# Altium schematic symbol library FPGA_Xilinx_Virtex5.SchLib: 41 symbols (part 7 of 27) (continued)
## XC5VLX50T-FF665 (continued)
part D pins: AA5 IO_L9P_CC_18 (io), AA6 VCCO_18 (power), AA7 IO_L7P_18 (io), AA8 IO_L7N_18 (io), AA9 IO_L19N_18 (io), AB5 IO_L9N_CC_18 (io), AB6 IO_L10P_CC_18 (io), AB7 IO_L10N_CC_18 (io), AB9 IO_L19P_18 (io), AB22 IO_L7N_17 (io), AB23 VCCO_17 (power), AC6 IO_L12P_VRN_18 (io), AC7 IO_L16N_18 (io), AC8 IO_L17P_18 (io), AC9 IO_L18N_18 (io), AC10 VCCO_18 (power), AC20 VCCO_17 (power), AC21 IO_L11P_CC_17 (io), AC22 IO_L7P_17 (io), AC23 IO_L6N_17 (io), AC24 IO_L6P_17 (io), AC26 IO_L0P_17 (io), AD4 IO_L14N_VREF_18 (io), AD5 IO_L12N_VRP_18 (io), AD6 IO_L16P_18 (io), AD7 VCCO_18 (power), AD8 IO_L17N_18 (io), AD9 IO_L18P_18 (io), AD10 IO_L4P_18 (io), AD11 IO_L2N_18 (io), AD13 IO_L19P_17 (io), AD14 IO_L19N_17 (io), AD15 IO_L16P_17 (io), AD16 IO_L15N_17 (io), AD18 IO_L13N_17 (io), AD19 IO_L10P_CC_17 (io), AD20 IO_L10N_CC_17 (io), AD21 IO_L11N_CC_17 (io), AD23 IO_L5N_17 (io), AD24 IO_L1N_17 (io), AD25 IO_L1P_17 (io), AD26 IO_L0N_17 (io), AE5 IO_L14P_18 (io), AE6 IO_L13P_18 (io), AE7 IO_L11N_CC_18 (io), AE8 IO_L11P_CC_18 (io), AE10 IO_L4N_VREF_18 (io), AE11 IO_L2P_18 (io), AE12 IO_L0N_18 (io), AE13 IO_L18N_17 (io), AE15 IO_L16N_17 (io), AE16 IO_L15P_17 (io), AE17 IO_L14P_17 (io), AE18 IO_L13P_17 (io), AE20 IO_L9N_CC_17 (io), AE21 IO_L8N_CC_17 (io), AE22 IO_L5P_17 (io), AE23 IO_L4N_VREF_17 (io), AE24 VCCO_17 (power), AE25 IO_L2P_17 (io), AE26 IO_L2N_17 (io), AF3 IO_L15N_18 (io), AF4 IO_L15P_18 (io), AF5 IO_L13N_18 (io), AF7 IO_L8P_CC_18 (io), AF8 IO_L8N_CC_18 (io), AF9 IO_L6P_18 (io), AF10 IO_L6N_18 (io), AF12 IO_L0P_18 (io), AF13 IO_L18P_17 (io), AF14 IO_L17N_17 (io), AF15 IO_L17P_17 (io), AF17 IO_L14N_VREF_17 (io), AF18 IO_L12N_VRP_17 (io), AF19 IO_L12P_VRN_17 (io), AF20 IO_L9P_CC_17 (io), AF22 IO_L8P_CC_17 (io), AF23 IO_L4P_17 (io), AF24 IO_L3N_17 (io), AF25 IO_L3P_17 (io), V8 IO_L1P_18 (io), V9 IO_L1N_18 (io), W8 IO_L3N_18 (io), W9 IO_L3P_18 (io), Y7 IO_L5P_18 (io), Y8 IO_L5N_18 (io)
part E pins: AA10 IO_L2P_A23_2 (io), AA12 IO_L4N_VREF_FOE_B_MOSI_2 (io), AA13 IO_L6P_D7_2 (io), AA14 IO_L6N_D6_2 (io), AA15 IO_L9N_D0_FS0_2 (io), AA16 VCCO_2 (power), AA17 IO_L5P_FWE_B_2 (io), AA18 IO_L3P_A21_2 (io), AA19 IO_L1N_CC_A24_2 (io), AD17 VCCO_2 (power), D13 IO_L2N_GC_VRP_3 (io), D14 IO_L2P_GC_VRN_3 (io), D15 IO_L0P_CC_GC_3 (io), D16 IO_L1P_CC_GC_3 (io), D17 VCCO_3 (power), D18 IO_L3N_GC_3 (io), E10 IO_L8P_GC_3 (io), E11 IO_L6N_GC_3 (io), E12 IO_L4N_GC_VREF_3 (io), E13 IO_L4P_GC_3 (io), E15 IO_L0N_CC_GC_3 (io), E16 IO_L1N_CC_GC_3 (io), E17 IO_L3P_GC_3 (io), E18 IO_L5P_GC_3 (io), E20 IO_L7P_GC_3 (io), E21 IO_L7N_GC_3 (io), F10 IO_L8N_GC_3 (io), F12 IO_L6P_GC_3 (io), F19 IO_L5N_GC_3 (io), F20 IO_L9P_GC_3 (io), G18 VCCO_3 (power), G21 IO_L9N_GC_3 (io), W11 IO_L0P_CC_RS1_2 (io), W14 IO_L8N_D2_FS2_2 (io), W16 IO_L7N_D4_2 (io), Y10 IO_L0N_CC_RS0_2 (io), Y11 IO_L2N_A22_2 (io), Y12 IO_L4P_FCS_B_2 (io), Y13 IO_L8P_D3_2 (io), Y15 IO_L9P_D1_FS1_2 (io), Y16 IO_L7P_D5_2 (io), Y17 IO_L5N_CSO_B_2 (io), Y18 IO_L3N_A20_2 (io), Y20 IO_L1P_CC_A25_2 (io)
part F pins: AA20 IO_L0N_GC_D14_4 (io), AB10 IO_L1P_GC_D13_4 (io), AB11 IO_L1N_GC_D12_4 (io), AB12 IO_L3N_GC_D8_4 (io), AB13 VCCO_4 (power), AB14 IO_L7P_GC_VRN_4 (io), AB15 IO_L9P_CC_GC_4 (io), AB16 IO_L8N_CC_GC_4 (io), AB17 IO_L6N_GC_4 (io), AB19 IO_L4P_GC_4 (io), AB20 IO_L2N_GC_D10_4 (io), AB21 IO_L2P_GC_D11_4 (io), AC11 IO_L3P_GC_D9_4 (io), AC12 IO_L5P_GC_4 (io), AC13 IO_L5N_GC_4 (io), AC14 IO_L7N_GC_VRP_4 (io), AC16 IO_L9N_CC_GC_4 (io), AC17 IO_L8P_CC_GC_4 (io), AC18 IO_L6P_GC_4 (io), AC19 IO_L4N_GC_VREF_4 (io), AE14 VCCO_4 (power), Y21 IO_L0P_GC_D15_4 (io)
part G pins: H2 MGTTXP0_112 (io), J1 MGTRXP0_112 (io), J2 MGTTXN0_112 (io), K1 MGTRXN0_112 (io), K3 MGTREFCLKN_112 (io), K4 MGTREFCLKP_112 (io), L1 MGTRXN1_112 (io), M1 MGTRXP1_112 (io), M2 MGTTXN1_112 (io), N2 MGTTXP1_112 (io), P2 MGTTXP0_114 (io), R1 MGTRXP0_114 (io), R2 MGTTXN0_114 (io), T1 MGTRXN0_114 (io), T3 MGTREFCLKN_114 (io), T4 MGTREFCLKP_114 (io), U1 MGTRXN1_114 (io), V1 MGTRXP1_114 (io), V2 MGTTXN1_114 (io), W2 MGTTXP1_114 (io)
part H pins: AA1 MGTRXP0_118 (io), AA2 MGTTXN0_118 (io), AB1 MGTRXN0_118 (io), AB3 MGTREFCLKN_118 (io), AB4 MGTREFCLKP_118 (io), AC1 MGTRXN1_118 (io), AD1 MGTRXP1_118 (io), AD2 MGTTXN1_118 (io), AE2 MGTTXP1_118 (io), B2 MGTTXP0_116 (io), C1 MGTRXP0_116 (io), C2 MGTTXN0_116 (io), D1 MGTRXN0_116 (io), D3 MGTREFCLKN_116 (io), D4 MGTREFCLKP_116 (io), E1 MGTRXN1_116 (io), F1 MGTRXP1_116 (io), F2 MGTTXN1_116 (io), G2 MGTTXP1_116 (io), Y2 MGTTXP0_118 (io)
part I pins: AA3 MGTAVTTRX_118 (power), AC3 MGTAVCC_118 (power), AC4 MGTAVCC_118 (power), AD3 MGTAVCCPLL_118 (power), AE3 MGTAVTTTX_118 (power), B3 MGTAVTTTX_116 (power), C3 MGTAVTTRX_116 (power), E3 MGTAVCC_116 (power), E4 MGTAVCC_116 (power), F3 MGTAVCCPLL_116 (power), G3 MGTAVTTTX_116 (power), H3 MGTAVTTTX_112 (power), J3 MGTAVTTRX_112 (power), L3 MGTAVCC_112 (power), L4 MGTAVCC_112 (power), M3 MGTAVCCPLL_112 (power), N3 MGTAVTTTX_112 (power), P3 MGTAVTTTX_114 (power), P4 MGTRREF_112 (power), P5 MGTAVTTRXC (power), R3 MGTAVTTRX_114 (power), U3 MGTAVCC_114 (power), U4 MGTAVCC_114 (power), V3 MGTAVCCPLL_114 (power), W3 MGTAVTTTX_114 (power), Y3 MGTAVTTTX_118 (power)
part J pins: F11 VCCO_0 (power), H12 INIT_B_0 (io), J10 D_IN_0 (io), J11 CCLK_0 (io), J12 VCCO_0 (power), J20 PROGRAM_B_0 (io), K11 DONE_0 (io), K20 HSWAPEN_0 (io), L20 CS_B_0 (io), M20 RDWR_B_0 (io), N14 VREFN_0 (io), N15 VP_0 (io), P14 VN_0 (io), P15 VREFP_0 (io), R14 DXN_0 (io), R15 DXP_0 (io), T20 M0_0 (io), U12 D_OUT_BUSY_0 (io), U20 M2_0 (io), V11 TCK_0 (io), V12 TDO_0 (io), V13 TDI_0 (io), W13 TMS_0 (io), W20 M1_0 (io)
part K pins: A2 GND (power), A6 GND (power), A11 GND (power), A16 GND (power), A21 GND (power), A26 GND (power), AA4 GND (power), AA11 GND (power), AA21 GND (power), AA26 GND (power), AB2 GND (power), AB8 GND (power), AB18 GND (power), AC2 GND (power), AC5 GND (power), AC15 GND (power), AC25 GND (power), AD12 GND (power), AD22 GND (power), AE4 GND (power), AE9 GND (power), AE19 GND (power), AF2 GND (power), AF6 GND (power), AF11 GND (power), AF16 GND (power), AF21 GND (power), AF26 GND (power), B8 GND (power), B18 GND (power), C4 GND (power), C5 GND (power), C15 GND (power), C20 GND (power), C25 GND (power), D2 GND (power), D12 GND (power), D22 GND (power), E2 GND (power), E9 GND (power), E19 GND (power), F4 GND (power), F6 GND (power), F16 GND (power), F26 GND (power), G13 GND (power), G23 GND (power), H10 GND (power), H14 GND (power), H15 VCCINT (power), H16 GND (power), H17 VCCINT (power), H20 GND (power), J4 GND (power), J7 GND (power), J13 GND (power), J14 VCCINT (power), J15 GND (power), J16 VCCINT (power), J17 GND (power), J18 VCCINT (power), J19 VBATT_0 (power), K2 GND (power), K9 VCCAUX (power), K10 GND (power), K12 GND (power), K13 VCCINT (power), K14 GND (power), K15 VCCINT (power), K16 GND (power), K17 VCCINT (power), K18 GND (power), K19 VCCINT (power), K24 GND (power), L2 GND (power), L9 GND (power), L10 VCCINT (power), L11 GND (power), L12 VCCINT (power), L13 GND (power), L14 VCCINT (power), L15 GND (power), L16 VCCINT (power), L17 GND (power), L18 VCCINT (power), L19 GND (power), L21 GND (power), L26 GND (power), M4 GND (power), M8 GND (power), M9 VCCAUX (power), M10 GND (power), M11 VCCINT (power), M12 GND (power), M13 VCCINT (power), M14 AVSS_0 (power), M15 AVDD_0 (power), M16 GND (power), M17 VCCINT (power), M18 GND (power), M19 VCCAUX (power), N5 GND (power), N9 GND (power), N10 VCCINT (power), N11 GND (power), N12 VCCINT (power), N13 GND (power), N16 VCCINT (power), N17 GND (power), N18 VCCINT (power), N19 GND (power), N20 VCCAUX (power), N25 GND (power), P9 VCCAUX (power), P10 GND (power), P11 VCCINT (power), P12 GND (power), P13 VCCINT (power), P16 GND (power), P17 VCCINT (power), P18 GND (power), P19 VCCAUX (power), P22 GND (power), R4 GND (power), R9 GND (power), R10 VCCINT (power), R11 GND (power), R12 VCCINT (power), R13 GND (power), R16 VCCINT (power), R17 GND (power), R18 VCCINT (power), R19 GND (power), T2 GND (power), T6 GND (power), T9 VCCAUX (power), T10 GND (power), T11 VCCINT (power), T12 GND (power), T13 VCCINT (power), T14 GND (power), T15 VCCINT (power), T16 GND (power), T17 VCCINT (power), T18 GND (power), T19 VCCAUX (power), T21 GND (power), T26 GND (power), U2 GND (power), U8 VCCAUX (power), U9 GND (power), U10 VCCINT (power), U11 GND (power), U13 GND (power), U14 VCCINT (power), U15 GND (power), U16 VCCINT (power), U17 GND (power), U18 VCCINT (power), U19 GND (power), U23 GND (power), V4 GND (power), V5 GND (power), V10 GND (power), V14 GND (power), V15 VCCINT (power), V16 GND (power), V17 VCCINT (power), V18 GND (power), V19 VCCAUX (power), V20 GND (power), W7 GND (power), W10 VCCAUX (power), W12 GND (power), W15 GND (power), W17 GND (power), W18 VCCINT (power), W19 GND (power), Y9 GND (power), Y14 GND (power), Y19 VCCAUX (power), Y24 GND (power)

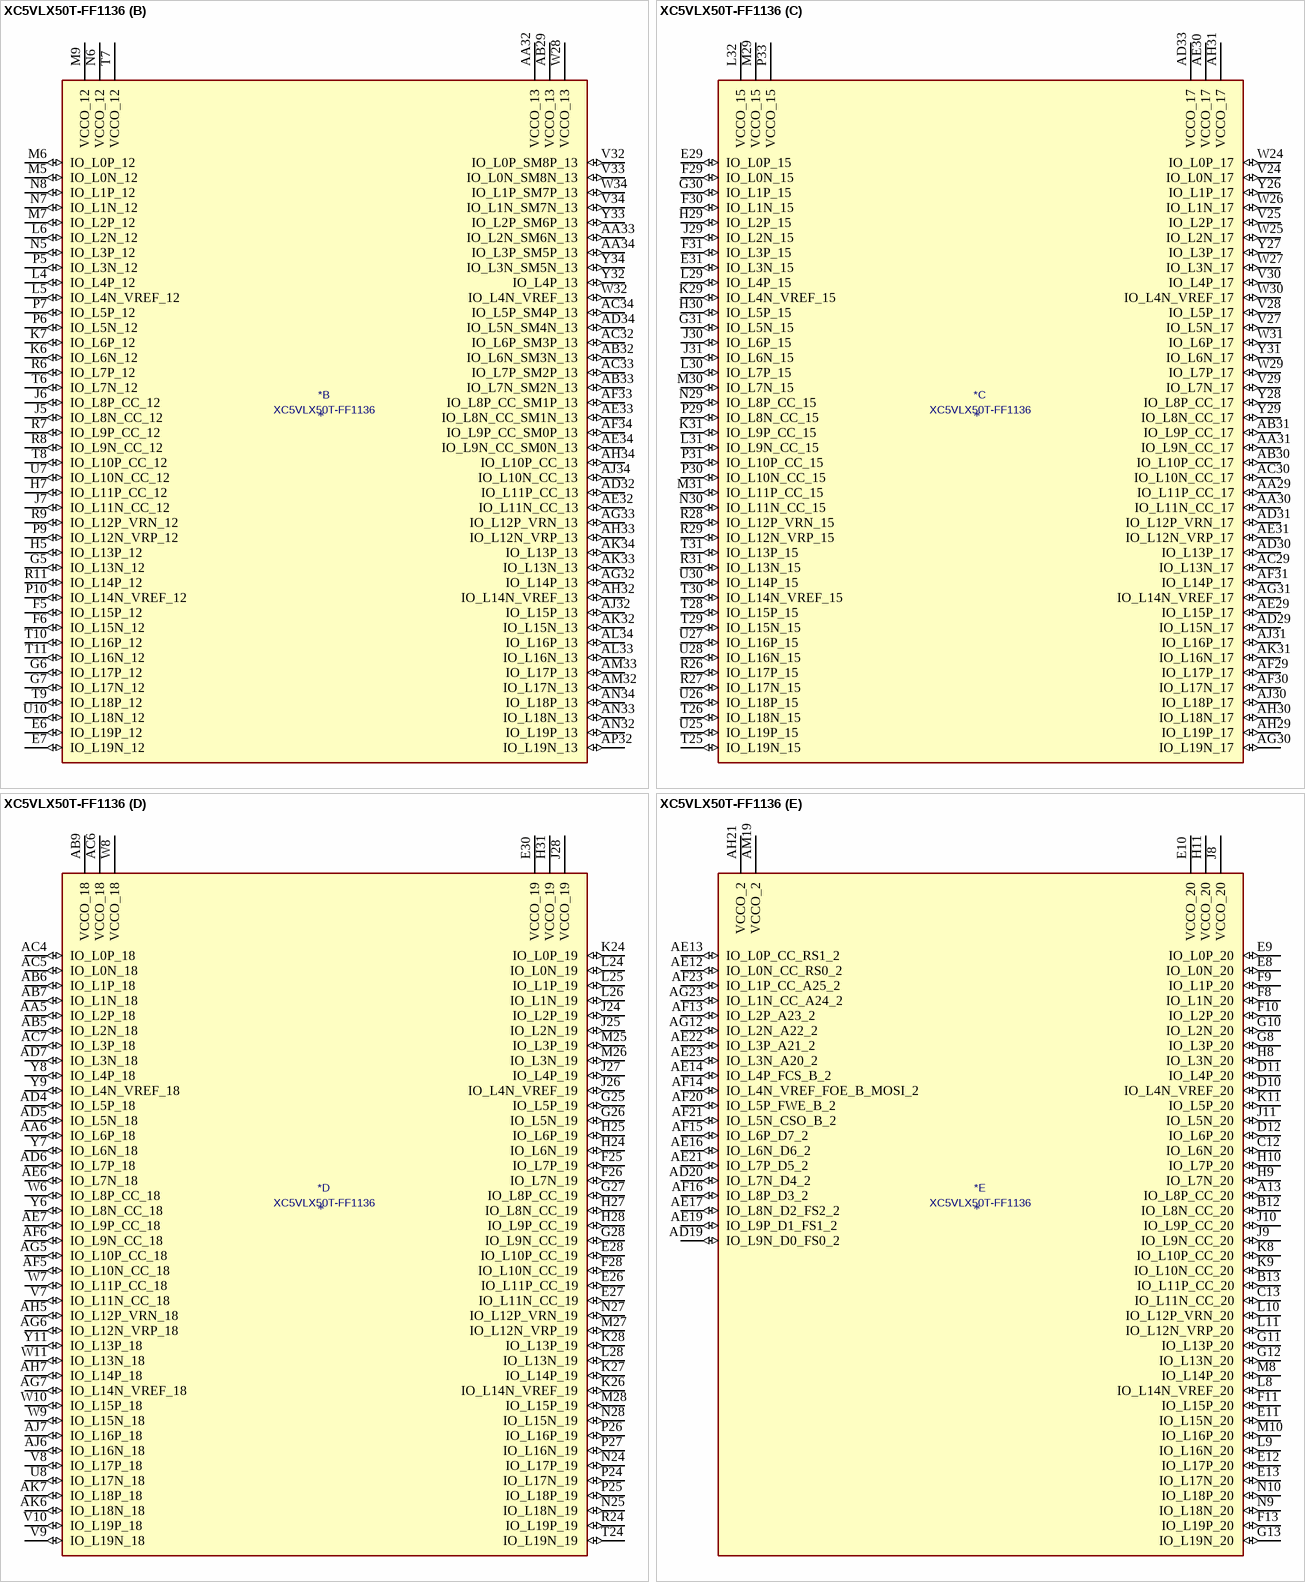
[diagram p44: symbol XC5VLX50T-FF1136]

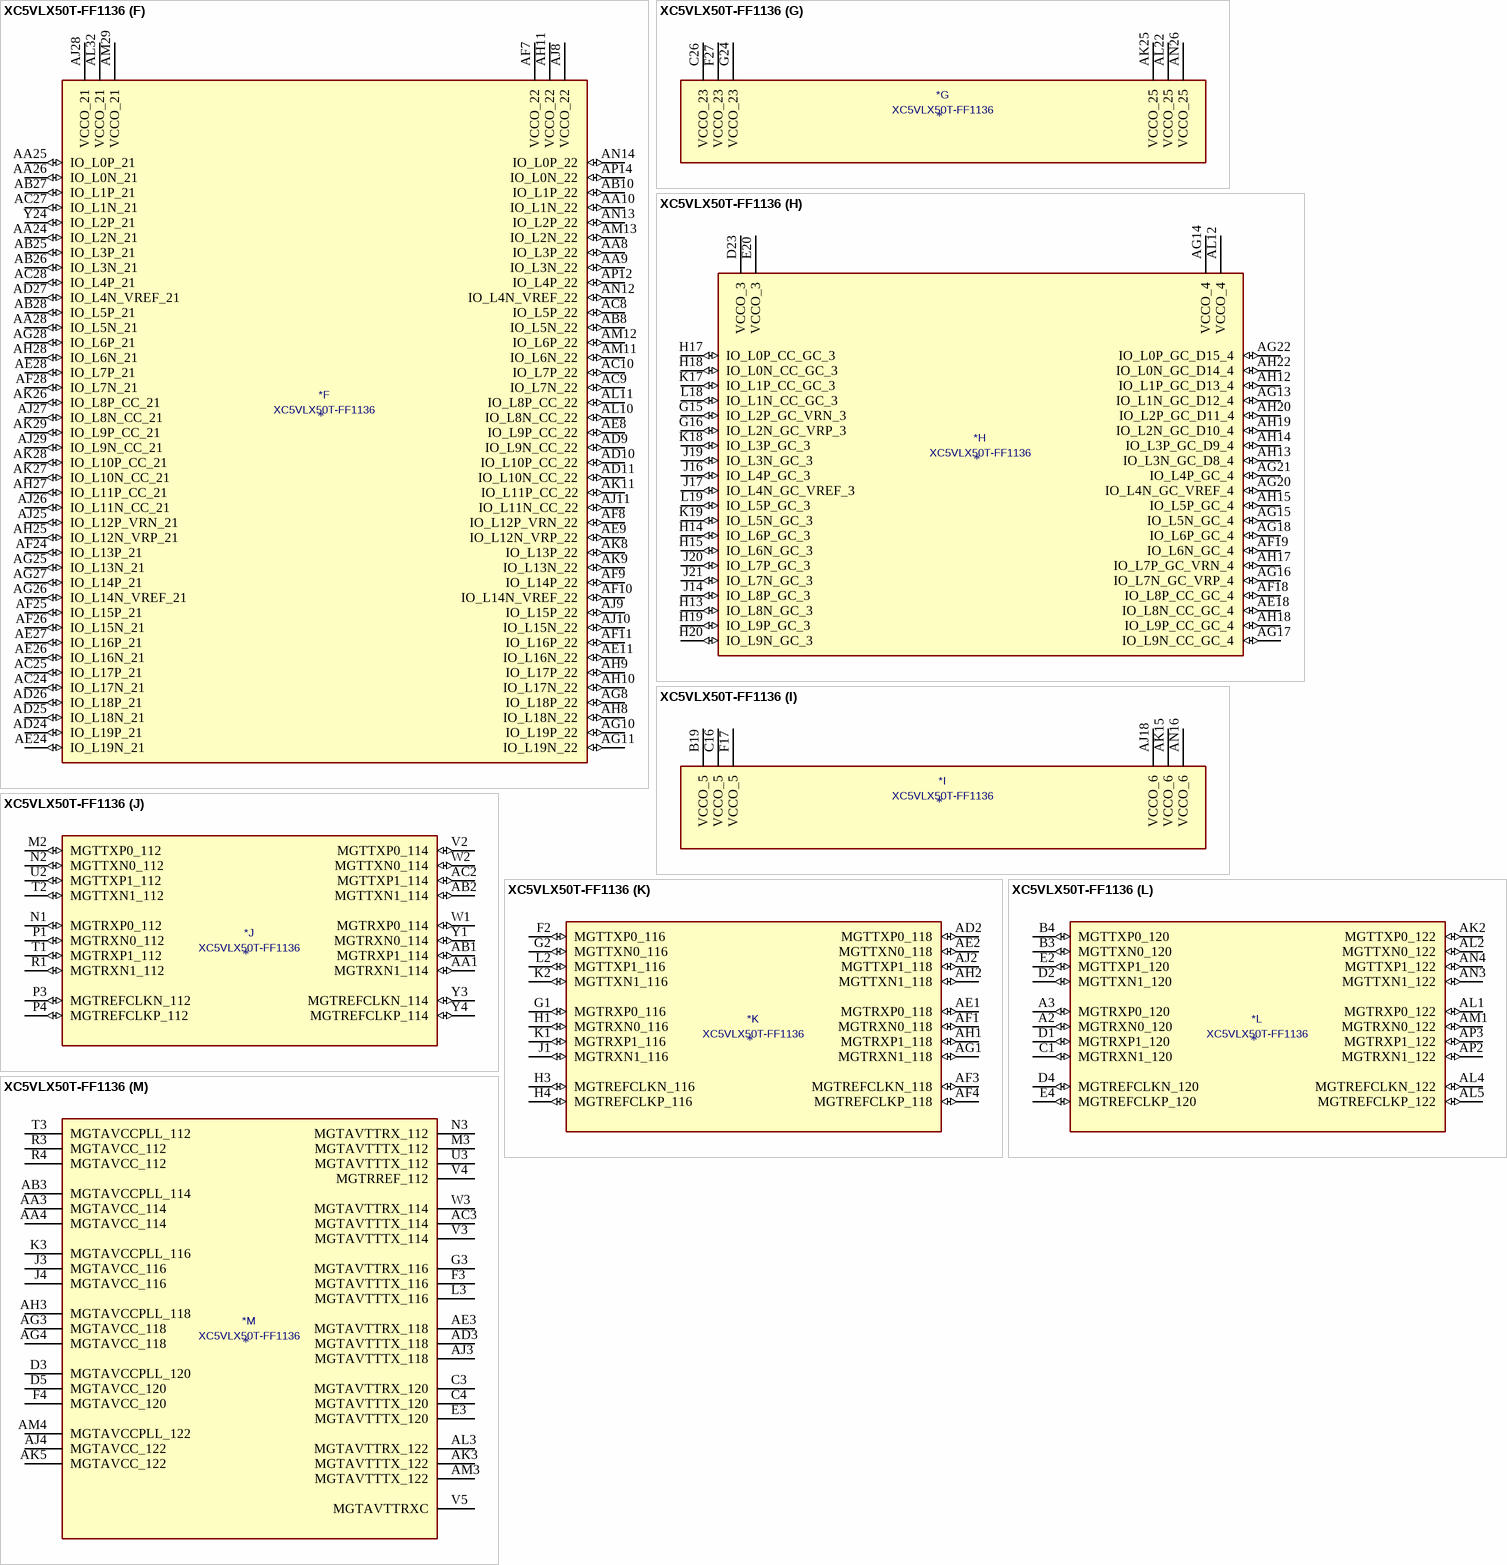
[diagram p45: symbol XC5VLX50T-FF1136]

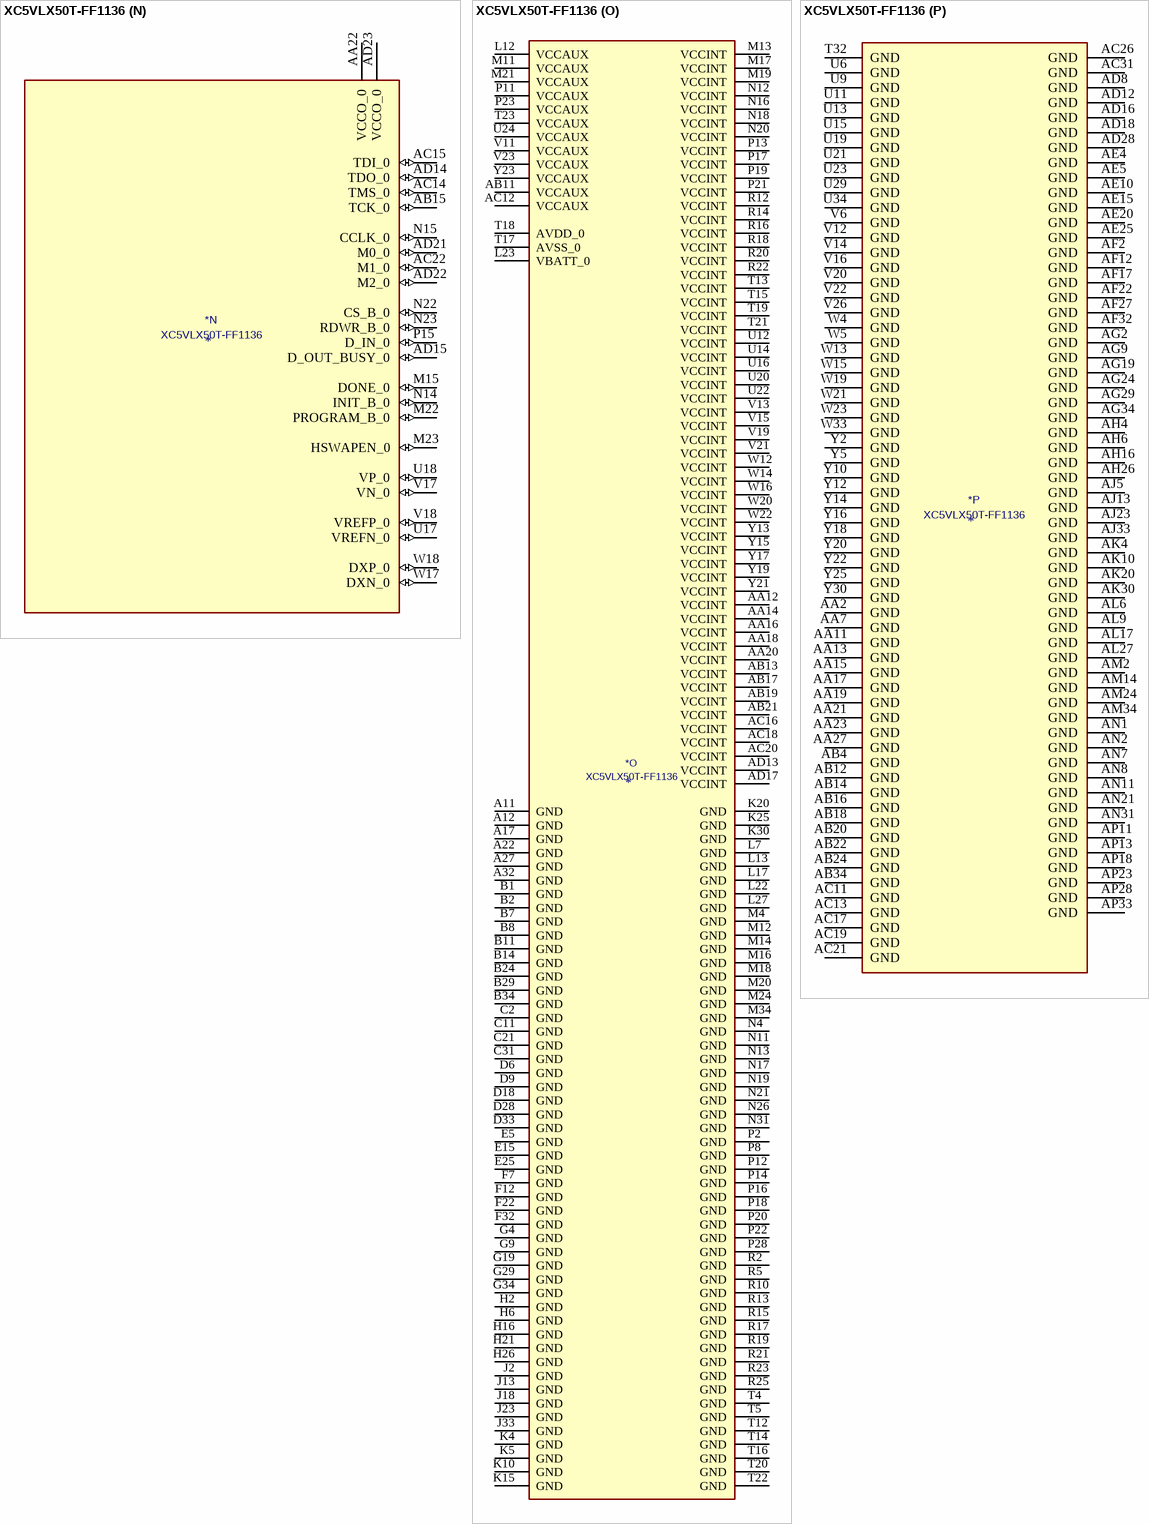
[diagram p46: symbol XC5VLX50T-FF1136]